# Altium footprint library 5-C-THD.PcbLib: 166 footprints (part 1 of 11)
Each footprint in its own frame and in the unit in brackets; x right, y up, seen from the top. Pads: shape width x height; smd on the part's side, far side on the other; paste and mask are expansions set on the pad; w line width, h text height; cw(c..) or ccw(c..) is an arc to the next point about the centre after c.
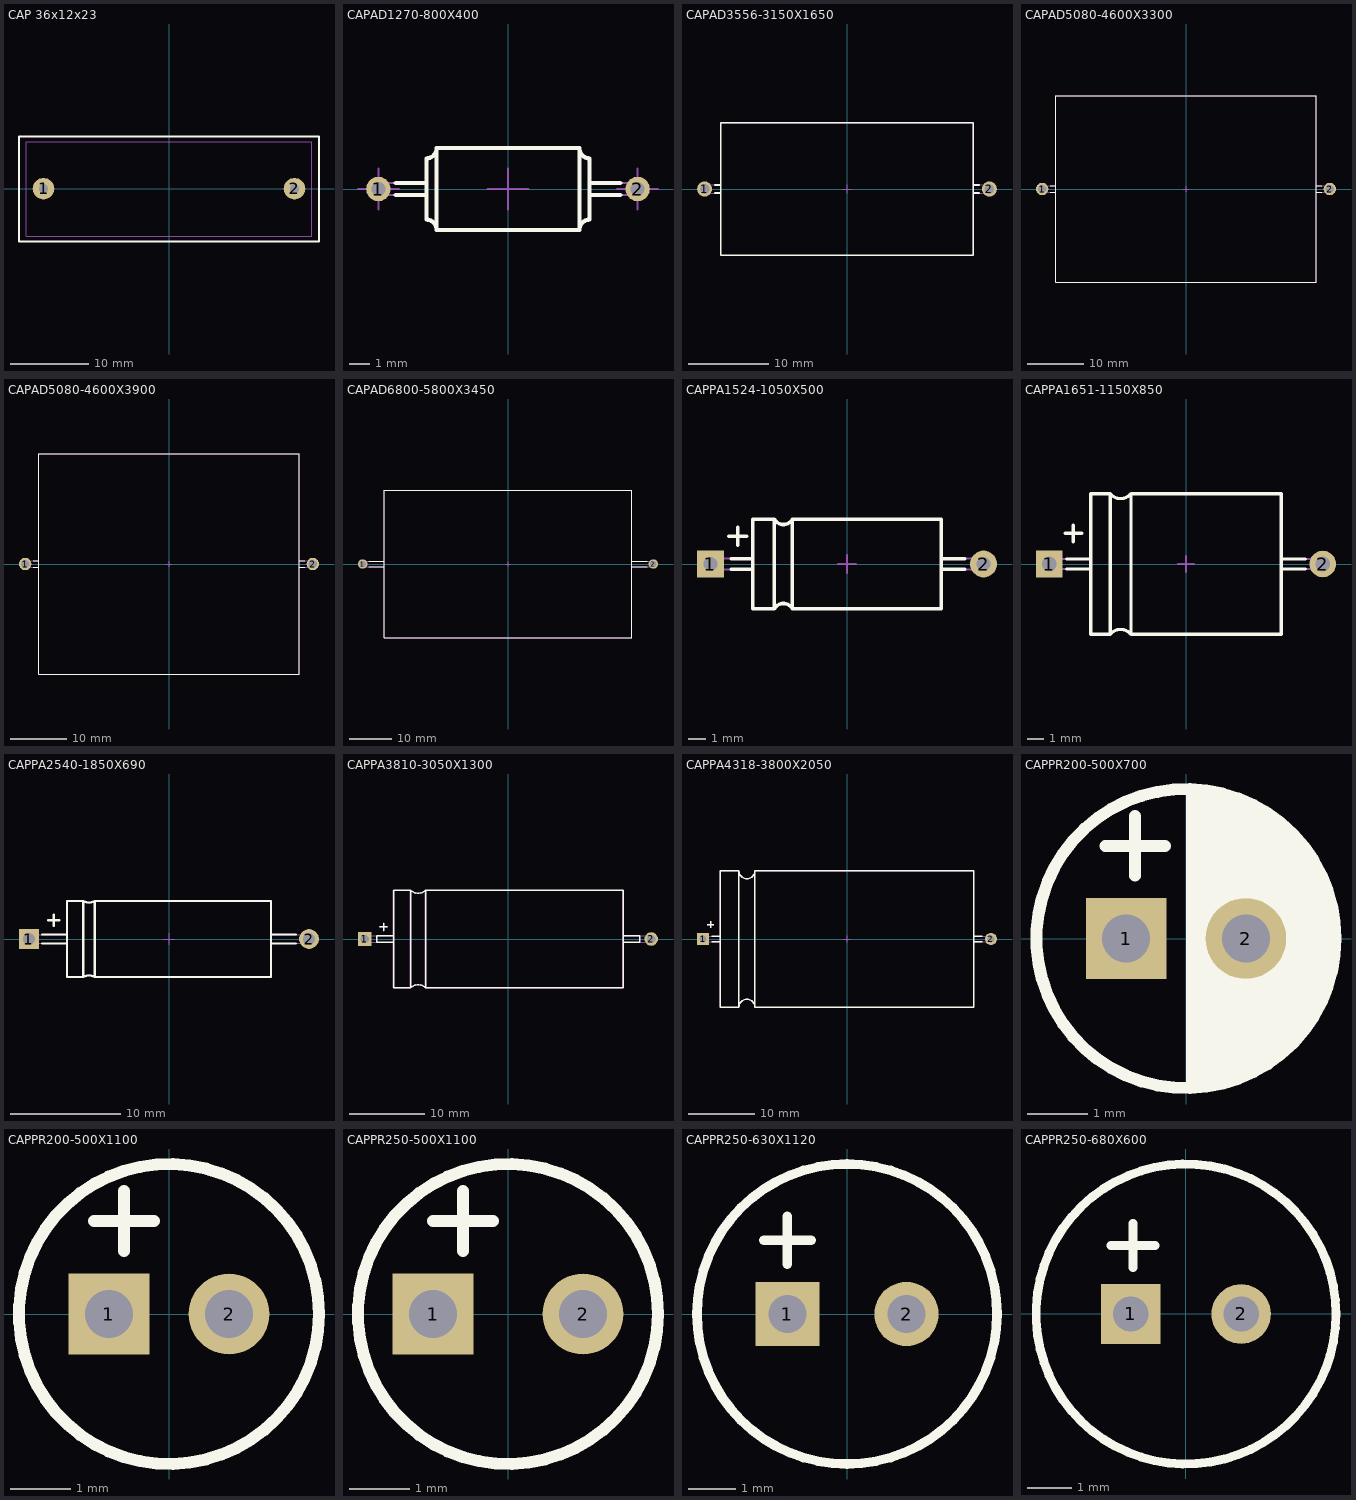
[diagram p0: the footprints below, top view; thin cyan lines are the x and y axes]

## CAP 36x12x23 [mm] "启动电容"
height 3.2
pads (2):
  round 2.75 hole 1.2: 1(-16,0) 2(16,0)
Top Overlay:
  lines w0.254: -19.126,-6.756 19.126,-6.756 19.126,6.68 -19.126,6.68 -19.126,-6.756
Mechanical 15:
  lines w0.127: -18.212,-6.045 18.212,-6.045 18.212,5.994 -18.212,5.994 -18.212,-6.045
3D body "1u-500v.stp": height 23, standoff -3.5, extent -18.5,-6.1 18.5,6

## CAPAD1270-800X400 [mm] "Capacitor Axial, Pin spacing 12.7mm - Body Length 8mm X Body Diameter 4mm"
height 4
pads (2):
  round 1.2 hole 0.7: 1(-6.35,0) 2(6.35,0)
Top Overlay:
  lines w0.2: -5.5,-0.3 -4,-0.3 ; -5.5,0.3 -4,0.3 ; 4,-0.3 5.5,-0.3 ; 4,0.3 5.5,0.3 ; -3.5,-2 ccw(c-4,-2) -4,-1.5 -4,1.5 ccw(c-4,2) -3.5,2 ; -3.5,-2 3.5,-2 ; -3.5,-2 -3.5,2 ; -3.5,2 3.5,2 ; 3.5,-2 cw(c4,-2) 4,-1.5 4,1.5 cw(c4,2) 3.5,2 ; 3.5,-2 3.5,2
Mechanical 8:
  lines w0.1: -7.35,0 -6.35,0 ; -6.35,-1 -6.35,0 ; -6.35,1 -6.35,0 ; -5.35,0 -6.35,0 ; -1,0 0,0 ; 0,-1 0,0 ; 0,1 0,0 ; 1,0 0,0 ; 5.35,0 6.35,0 ; 6.35,-1 6.35,0 ; 6.35,1 6.35,0 ; 7.35,0 6.35,0
Mechanical 14:
  lines w0.1: -4,-0.3 -6.35,-0.3 cw(c-6.35,0) -6.35,0.3 -4,0.3 ; 4,-0.3 6.35,-0.3 ccw(c6.35,0) 6.35,0.3 4,0.3 ; -3.5,-2 ccw(c-4,-2) -4,-1.5 -4,1.5 ccw(c-4,2) -3.5,2 ; -3.5,-2 3.5,-2 ; -3.5,-2 -3.5,2 ; -3.5,2 3.5,2 ; 3.5,-2 cw(c4,-2) 4,-1.5 4,1.5 cw(c4,2) 3.5,2 ; 3.5,-2 3.5,2
3D body "v150-080.stp": height 0.02, standoff -1.65, extent -7.1,-0.75 -5.6,0.75
3D body "v150-080.stp": height 0.02, standoff -1.65, extent 5.6,-0.75 7.1,0.75
3D body "CAPA1270-800X400.stp": height 4, standoff -3.6, extent -6.65,-2 6.65,2

## CAPAD3556-3150X1650 [mm] "Capacitor Axial, Pin spacing 35.56mm - Body Length 31.5mm X Body Diameter 16.5mm"
height 16.5
pads (2):
  round 1.9 hole 1.2: 1(-17.78,0) 2(17.78,0)
Top Overlay:
  lines w0.2: -16.51,-0.5 -15.75,-0.5 ; -16.51,0.5 -15.75,0.5 ; 15.75,-0.5 16.51,-0.5 ; 15.75,0.5 16.51,0.5 ; -15.75,-8.25 -15.75,8.25 15.75,8.25 15.75,-8.25 -15.75,-8.25
Mechanical 8:
  lines w0.1: -18.28,0 -17.78,0 ; -17.78,-0.5 -17.78,0 ; -17.78,0.5 -17.78,0 ; -17.28,0 -17.78,0 ; -0.5,0 0,0 ; 0,-0.5 0,0 ; 0,0.5 0,0 ; 0.5,0 0,0 ; 17.28,0 17.78,0 ; 17.78,-0.5 17.78,0 ; 17.78,0.5 17.78,0 ; 18.28,0 17.78,0
Mechanical 14:
  lines w0.1: -15.75,-0.5 -17.78,-0.5 cw(c-17.78,0) -17.78,0.5 -15.75,0.5 ; 15.75,-0.5 17.78,-0.5 ccw(c17.78,0) 17.78,0.5 15.75,0.5 ; -15.75,-8.25 -15.75,8.25 15.75,8.25 15.75,-8.25 -15.75,-8.25
3D body "CAPAD3556-3150X1650.stp": height 16.5, standoff -3.1, extent -18.28,-8.25 18.28,8.25
3D body "v150-080.stp": height 0.02, standoff -1.65, extent 17.03,-0.75 18.53,0.75
3D body "v150-080.stp": height 0.02, standoff -1.65, extent -18.53,-0.75 -17.03,0.75

## CAPAD5080-4600X3300 [mm] "Capacitor Axial, Pin spacing 50.8mm - Body Length 46mm X Body Diameter 33mm"
height 33
pads (2):
  round 2.2 hole 1.5: 1(-25.4,0) 2(25.4,0)
Top Overlay:
  lines w0.2: -24.025,-0.6 -23,-0.6 ; -24.025,0.6 -23,0.6 ; 23,-0.6 24.025,-0.6 ; 23,0.6 24.025,0.6 ; -23,-16.5 23,-16.5 23,16.5 -23,16.5 -23,-16.5
Mechanical 8:
  lines w0.1: -25.9,0 -25.4,0 ; -25.4,-0.5 -25.4,0 ; -25.4,0.5 -25.4,0 ; -24.9,0 -25.4,0 ; -0.5,0 0,0 ; 0,-0.5 0,0 ; 0,0.5 0,0 ; 0.5,0 0,0 ; 24.9,0 25.4,0 ; 25.4,-0.5 25.4,0 ; 25.4,0.5 25.4,0 ; 25.9,0 25.4,0
Mechanical 14:
  lines w0.1: -23,-0.6 -25.4,-0.6 cw(c-25.4,0) -25.4,0.6 -23,0.6 ; 23,-0.6 25.4,-0.6 ccw(c25.4,0) 25.4,0.6 23,0.6 ; -23,-16.5 23,-16.5 23,16.5 -23,16.5 -23,-16.5
3D body "CAPAD5080-4600X3300.stp": height 33, standoff -3.8, extent -26,-16.5 26,16.5
3D body "v150-080.stp": height 0.02, standoff -1.65, extent 24.65,-0.75 26.15,0.75
3D body "v150-080.stp": height 0.02, standoff -1.65, extent -26.15,-0.75 -24.65,0.75

## CAPAD5080-4600X3900 [mm] "Capacitor Axial, Pin spacing 50.8mm - Body Length 46mm X Body Diameter 39mm"
height 39
pads (2):
  round 2.2 hole 1.5: 1(-25.4,0) 2(25.4,0)
Top Overlay:
  lines w0.2: -24.025,-0.6 -23,-0.6 ; -24.025,0.6 -23,0.6 ; 23,-0.6 24.025,-0.6 ; 23,0.6 24.025,0.6 ; -23,-19.5 23,-19.5 23,19.5 -23,19.5 -23,-19.5
Mechanical 8:
  lines w0.1: -25.9,0 -25.4,0 ; -25.4,-0.5 -25.4,0 ; -25.4,0.5 -25.4,0 ; -24.9,0 -25.4,0 ; -0.5,0 0,0 ; 0,-0.5 0,0 ; 0,0.5 0,0 ; 0.5,0 0,0 ; 24.9,0 25.4,0 ; 25.4,-0.5 25.4,0 ; 25.4,0.5 25.4,0 ; 25.9,0 25.4,0
Mechanical 14:
  lines w0.1: -23,-0.6 -25.4,-0.6 cw(c-25.4,0) -25.4,0.6 -23,0.6 ; 23,-0.6 25.4,-0.6 ccw(c25.4,0) 25.4,0.6 23,0.6 ; -23,-19.5 -23,19.5 23,19.5 23,-19.5 -23,-19.5
3D body "CAPAD5080-4600X3900.stp": height 39, standoff -3.8, extent -26,-19.5 26,19.5
3D body "v150-080.stp": height 0.02, standoff -1.65, extent 24.65,-0.75 26.15,0.75
3D body "v150-080.stp": height 0.02, standoff -1.65, extent -26.15,-0.75 -24.65,0.75

## CAPAD6800-5800X3450 [mm] "Capacitor Axial Diameter, Pin spacing 68mm - Body Length 58mm X Body Diameter 34.5mm"
height 34.5
pads (2):
  round 2.2 hole 1.5: 1(-34,0) 2(34,0)
Top Overlay:
  lines w0.2: -32.625,-0.6 -29,-0.6 ; -32.625,0.6 -29,0.6 ; 29,-0.6 32.625,-0.6 ; 29,0.6 32.625,0.6 ; -29,-17.25 29,-17.25 29,17.25 -29,17.25 -29,-17.25
Mechanical 8:
  lines w0.1: -34.5,0 -34,0 ; -34,-0.5 -34,0 ; -34,0.5 -34,0 ; -33.5,0 -34,0 ; -0.5,0 0,0 ; 0,-0.5 0,0 ; 0,0.5 0,0 ; 0.5,0 0,0 ; 33.5,0 34,0 ; 34,-0.5 34,0 ; 34,0.5 34,0 ; 34.5,0 34,0
Mechanical 14:
  lines w0.1: -29,-0.6 -34,-0.6 cw(c-34,0) -34,0.6 -29,0.6 ; 29,-0.6 34,-0.6 ccw(c34,0) 34,0.6 29,0.6 ; -29,-17.25 29,-17.25 29,17.25 -29,17.25 -29,-17.25
3D body "CAPAD6800-5800X3450.stp": height 34.5, standoff -3.75, extent -34.6,-17.25 34.6,17.25
3D body "v150-080.stp": height 0.02, standoff -1.65, extent 33.25,-0.75 34.75,0.75
3D body "v150-080.stp": height 0.02, standoff -1.65, extent -34.75,-0.75 -33.25,0.75

## CAPPA1524-1050X500 [mm] "Capacitor Axial, Pin spacing 15.24mm - Body Length 10.5mm X Body Diameter 5.0mm"
height 5
pads (2):
  rect 1.5x1.5 hole 0.8: 1(-7.62,0)
  round 1.5 hole 0.8: 2(7.62,0)
Top Overlay:
  lines w0.2: -6.6,1.55 -5.6,1.55 ; -6.47,-0.3 -5.25,-0.3 ; -6.47,0.3 -5.25,0.3 ; -6.1,1.05 -6.1,2.05 ; 5.25,-0.3 6.562,-0.3 ; 5.25,0.3 6.562,0.3 ; -4.05,-2.5 cw(c-3.55,-2.767) -3.05,-2.5 ; -4.05,-2.5 -5.25,-2.5 -5.25,2.5 -4.05,2.5 ; -4.05,-2.5 -4.05,2.5 ; -4.05,2.5 ccw(c-3.55,2.767) -3.05,2.5 ; -3.05,-2.5 5.25,-2.5 5.25,2.5 -3.05,2.5 ; -3.05,-2.5 -3.05,2.5
Mechanical 8:
  lines w0.1: -8.12,0 -7.62,0 ; -7.62,-0.5 -7.62,0 ; -7.62,0.5 -7.62,0 ; -7.12,0 -7.62,0 ; -0.5,0 0,0 ; 0,-0.5 0,0 ; 0,0.5 0,0 ; 0.5,0 0,0 ; 7.12,0 7.62,0 ; 7.62,-0.5 7.62,0 ; 7.62,0.5 7.62,0 ; 8.12,0 7.62,0
Mechanical 14:
  lines w0.1: -6.6,1.55 -5.6,1.55 ; -6.1,1.05 -6.1,2.05 ; -5.25,-0.3 -7.62,-0.3 cw(c-7.62,0) -7.62,0.3 -5.25,0.3 ; 5.25,-0.3 7.62,-0.3 ccw(c7.62,0) 7.62,0.3 5.25,0.3 ; -4.05,-2.5 cw(c-3.55,-2.767) -3.05,-2.5 ; -4.05,-2.5 -5.25,-2.5 -5.25,2.5 -4.05,2.5 ; -4.05,-2.5 -4.05,2.5 ; -4.05,2.5 ccw(c-3.55,2.767) -3.05,2.5 ; -3.05,-2.5 -3.05,2.5 ; -3.05,-2.5 5.25,-2.5 5.25,2.5 -3.05,2.5
3D body "v150-080.stp": height 0.02, standoff -1.65, extent -8.37,-0.75 -6.87,0.75
3D body "v150-080.stp": height 0.02, standoff -1.65, extent 6.87,-0.75 8.37,0.75
3D body "CAPPA1524-1050X500.stp": height 5, standoff -3.1, extent -7.92,-2.5 7.92,2.5

## CAPPA1651-1150X850 [mm] "Capacitor Axial, Pin spacing 16.51mm - Body Length 11.5mm X Body Diameter 8.5mm"
height 8.5
pads (2):
  rect 1.6x1.6 hole 0.9: 1(-8.255,0)
  round 1.6 hole 0.9: 2(8.255,0)
Top Overlay:
  lines w0.2: -7.3,1.85 -6.3,1.85 ; -7.197,-0.3 -5.75,-0.3 ; -7.197,0.3 -5.75,0.3 ; -6.8,1.35 -6.8,2.35 ; 5.75,-0.3 7.197,-0.3 ; 5.75,0.3 7.197,0.3 ; -4.574,-4.25 cw(c-3.948,-4.748) -3.322,-4.25 ; -4.574,-4.25 -5.75,-4.25 -5.75,4.25 -4.574,4.25 ; -4.574,-4.25 -4.574,4.25 ; -4.574,4.25 ccw(c-3.948,4.748) -3.322,4.25 ; -3.322,-4.25 5.75,-4.25 5.75,4.25 -3.322,4.25 ; -3.322,-4.25 -3.322,4.25
Mechanical 8:
  lines w0.1: -8.755,0 -8.255,0 ; -8.255,-0.5 -8.255,0 ; -8.255,0.5 -8.255,0 ; -7.755,0 -8.255,0 ; -0.5,0 0,0 ; 0,-0.5 0,0 ; 0,0.5 0,0 ; 0.5,0 0,0 ; 7.755,0 8.255,0 ; 8.255,-0.5 8.255,0 ; 8.255,0.5 8.255,0 ; 8.755,0 8.255,0
Mechanical 14:
  lines w0.1: -7.3,1.85 -6.3,1.85 ; -6.8,1.35 -6.8,2.35 ; -5.75,-0.3 -8.255,-0.3 cw(c-8.255,0) -8.255,0.3 -5.75,0.3 ; 5.75,-0.3 8.255,-0.3 ccw(c8.255,0) 8.255,0.3 5.75,0.3 ; -4.574,-4.25 cw(c-3.948,-4.748) -3.322,-4.25 ; -4.574,-4.25 -5.75,-4.25 -5.75,4.25 -4.574,4.25 ; -4.574,-4.25 -4.574,4.25 ; -4.574,4.25 ccw(c-3.948,4.748) -3.322,4.25 ; -3.322,-4.25 5.75,-4.25 5.75,4.25 -3.322,4.25 ; -3.322,-4.25 -3.322,4.25
3D body "v150-080.stp": height 0.02, standoff -1.65, extent -9.005,-0.75 -7.505,0.75
3D body "v150-080.stp": height 0.02, standoff -1.65, extent 7.505,-0.75 9.005,0.75
3D body "CAPPA1651-1150X850.stp": height 8.5, standoff -3.8, extent -8.555,-4.25 8.555,4.25

## CAPPA2540-1850X690 [mm] "Capacitor Axial, Pin spacing 25.4mm - Body Length 18.5mm X Body Diameter 6.9mm"
height 6.9
pads (2):
  rect 1.8x1.8 hole 1.1: 1(-12.7,0)
  round 1.8 hole 1.1: 2(12.7,0)
Top Overlay:
  lines w0.2: -11.5,-0.4 -9.25,-0.4 ; -11.5,0.4 -9.25,0.4 ; -10.95,1.7 -9.95,1.7 ; -10.45,1.2 -10.45,2.2 ; 9.25,-0.4 11.5,-0.4 ; 9.25,0.4 11.5,0.4 ; -7.775,-3.45 cw(c-7.25,-4.294) -6.725,-3.45 ; -7.775,-3.45 -7.775,3.45 ; -7.775,-3.45 -9.25,-3.45 -9.25,3.45 -7.775,3.45 ; -7.775,3.45 ccw(c-7.25,4.294) -6.725,3.45 ; -6.725,-3.45 -6.725,3.45 ; -6.725,-3.45 9.25,-3.45 9.25,3.45 -6.725,3.45
Mechanical 8:
  lines w0.1: -13.2,0 -12.7,0 ; -12.7,-0.5 -12.7,0 ; -12.7,0.5 -12.7,0 ; -12.2,0 -12.7,0 ; -0.5,0 0,0 ; 0,-0.5 0,0 ; 0,0.5 0,0 ; 0.5,0 0,0 ; 12.2,0 12.7,0 ; 12.7,-0.5 12.7,0 ; 12.7,0.5 12.7,0 ; 13.2,0 12.7,0
Mechanical 14:
  lines w0.1: -10.95,1.7 -9.95,1.7 ; -10.45,1.2 -10.45,2.2 ; -9.25,-0.4 -12.7,-0.4 cw(c-12.7,0) -12.7,0.4 -9.25,0.4 ; 9.25,-0.4 12.7,-0.4 ccw(c12.7,0) 12.7,0.4 9.25,0.4 ; -7.775,-3.45 cw(c-7.25,-4.294) -6.725,-3.45 ; -7.775,-3.45 -7.775,3.45 ; -7.775,-3.45 -9.25,-3.45 -9.25,3.45 -7.775,3.45 ; -7.775,3.45 ccw(c-7.25,4.294) -6.725,3.45 ; -6.725,-3.45 -6.725,3.45 ; -6.725,-3.45 9.25,-3.45 9.25,3.45 -6.725,3.45
3D body "v150-080.stp": height 0.02, standoff -1.65, extent -13.45,-0.75 -11.95,0.75
3D body "v150-080.stp": height 0.02, standoff -1.65, extent 11.95,-0.75 13.45,0.75
3D body "CAPPA2540-1850X690.stp": height 6.9, standoff -3.6, extent -13.1,-3.45 13.1,3.45

## CAPPA3810-3050X1300 [mm] "Capacitor Axial, Pin spacing 38.1mm - Body Length 30.5mm X Body Diameter 13mm"
height 13
pads (2):
  rect 1.8x1.8 hole 1.1: 1(-19.05,0)
  round 1.8 hole 1.1: 2(19.05,0)
Top Overlay:
  lines w0.2: -17.05,1.6 -16.05,1.6 ; -16.55,1.1 -16.55,2.1 ; -15.2,-0.4 -17.45,-0.4 -17.45,0.4 -15.2,0.4 ; 15.3,-0.4 17.55,-0.4 17.55,0.4 15.3,0.4 ; -12.95,-6.5 cw(c-11.95,-7.5) -10.95,-6.5 ; -12.95,-6.5 -15.2,-6.5 -15.2,6.5 -12.95,6.5 ; -12.95,-6.5 -12.95,6.5 ; -12.95,6.5 ccw(c-11.95,7.5) -10.95,6.5 ; -10.95,-6.5 15.3,-6.5 15.3,6.5 -10.95,6.5 ; -10.95,-6.5 -10.95,6.5
Mechanical 14:
  lines w0.1: -17.05,1.6 -16.05,1.6 ; -16.55,1.1 -16.55,2.1 ; -15.25,-0.4 -19.05,-0.4 cw(c-19,0) -19.05,0.4 -15.25,0.4 ; 15.25,-0.4 19.05,-0.4 ccw(c19,0) 19.05,0.4 15.25,0.4 ; -13,-6.5 cw(c-12,-7.5) -11,-6.5 ; -13,-6.5 -13,6.5 ; -13,-6.5 -15.25,-6.5 -15.25,6.5 -13,6.5 ; -13,6.5 ccw(c-12,7.5) -11,6.5 ; -11,-6.5 -11,6.5 ; -11,-6.5 15.25,-6.5 15.25,6.5 -11,6.5
3D body "v150-080.stp": height 0.02, standoff -1.65, extent -19.8,-0.75 -18.3,0.75
3D body "v150-080.stp": height 0.02, standoff -1.65, extent 18.3,-0.75 19.8,0.75
3D body "CAPPA3810-30500X1300.stp": height 13, standoff -3.8, extent -19.5,-6.5 19.5,6.5

## CAPPA4318-3800X2050 [mm] "Capacitor Axial, Pin spacing 43mm - Body Length 38mm X Body Diameter 20.5mm"
height 20.5
pads (2):
  rect 1.8x1.8 hole 1.1: 1(-21.59,0)
  round 1.8 hole 1.1: 2(21.59,0)
Top Overlay:
  lines w0.2: -20.95,2.15 -19.95,2.15 ; -20.45,1.65 -20.45,2.65 ; -20.248,-0.4 -19,-0.4 ; -20.248,0.4 -19,0.4 ; 19,-0.4 20.248,-0.4 ; 19,0.4 20.248,0.4 ; -16.2,-10.25 cw(c-15,-10.25) -13.8,-10.25 ; -16.2,-10.25 -16.2,10.25 ; -16.2,-10.25 -19,-10.25 -19,10.25 -16.2,10.25 ; -16.2,10.25 ccw(c-15,10.25) -13.8,10.25 ; -13.8,-10.25 -13.8,10.25 ; -13.8,-10.25 19,-10.25 19,10.25 -13.8,10.25
Mechanical 8:
  lines w0.1: -22.09,0 -21.59,0 ; -21.59,-0.5 -21.59,0 ; -21.59,0.5 -21.59,0 ; -21.09,0 -21.59,0 ; -0.5,0 0,0 ; 0,-0.5 0,0 ; 0,0.5 0,0 ; 0.5,0 0,0 ; 21.09,0 21.59,0 ; 21.59,-0.5 21.59,0 ; 21.59,0.5 21.59,0 ; 22.09,0 21.59,0
Mechanical 14:
  lines w0.1: -20.95,2.15 -19.95,2.15 ; -20.45,1.65 -20.45,2.65 ; -19,-0.4 -21.59,-0.4 cw(c-21.59,0) -21.59,0.4 -19,0.4 ; 19,-0.4 21.59,-0.4 ccw(c21.59,0) 21.59,0.4 19,0.4 ; -16.2,-10.25 cw(c-15,-10.25) -13.8,-10.25 ; -16.2,-10.25 -16.2,10.25 ; -16.2,-10.25 -19,-10.25 -19,10.25 -16.2,10.25 ; -16.2,10.25 ccw(c-15,10.25) -13.8,10.25 ; -13.8,-10.25 19,-10.25 19,10.25 -13.8,10.25 ; -13.8,-10.25 -13.8,10.25
3D body "v150-080.stp": height 0.02, standoff -1.65, extent -22.34,-0.75 -20.84,0.75
3D body "v150-080.stp": height 0.02, standoff -1.65, extent 20.84,-0.75 22.34,0.75
3D body "CAPPA4318-3800X2050.stp": height 20.5, standoff -3.8, extent -21.99,-10.25 21.99,10.25

## CAPPR200-500X700 [mm] "Capacitor, Radial, Pin spacing 2.0mm - Body Diameter 5.0mm X Body Height 7mm"
height 7
pads (2):
  rect 1.35x1.35 hole 0.8: 1(-1,0)
  round 1.35 hole 0.8: 2(1,0)
Top Overlay:
  circle w0.2: c0,0 r2.5
  region: 0,-2.515 0,2.489 0.635,2.388 1.295,2.108 1.981,1.6 2.311,0.965 2.489,0.279 2.489,-0.305 2.261,-1.118 1.803,-1.778 1.295,-2.159 0.686,-2.438
  lines w0.2: -1.35,1.55 -0.35,1.55 ; -0.85,1.05 -0.85,2.05
Mechanical 13:
  circle w0.1: c0,0 r2.5
Mechanical 14:
  circle w0.1: c0,0 r2.5
  lines w0.1: -1.35,1.55 -0.35,1.55 ; -0.85,1.05 -0.85,2.05
3D body "CAPPR200-500X700.stp": height 7, standoff -3.6, extent -2.512,-2.512 2.488,2.488

## CAPPR200-500X1100 [mm] "Capacitor, Radial, Pin spacing 2.0mm - Body Diameter 5.0mm X Body Height 11mm"
height 11
pads (2):
  rect 1.35x1.35 hole 0.8: 1(-1,0)
  round 1.35 hole 0.8: 2(1,0)
Top Overlay:
  circle w0.2: c0,0 r2.5
  lines w0.2: -1.25,1.55 -0.25,1.55 ; -0.75,1.05 -0.75,2.05
Mechanical 13:
  circle w0.1: c0,0 r2.5
Mechanical 14:
  circle w0.1: c0,0 r2.5
  lines w0.1: -1.25,1.55 -0.25,1.55 ; -0.75,1.05 -0.75,2.05
3D body "CAPPR200-500X1100.stp": height 10.9, standoff -3.6, extent -2.512,-2.512 2.488,2.488

## CAPPR250-500X1100 [mm] "Capacitor, Radial, Pin spacing 2.5mm - Body Diameter 5.0mm X Body Height 11mm"
height 11
pads (2):
  rect 1.35x1.35 hole 0.8: 1(-1.25,0)
  round 1.35 hole 0.8: 2(1.25,0)
Top Overlay:
  circle w0.2: c0,0 r2.5
  lines w0.2: -1.25,1.55 -0.25,1.55 ; -0.75,1.05 -0.75,2.05
Mechanical 13:
  circle w0.1: c0,0 r2.5
Mechanical 14:
  circle w0.1: c0,0 r2.5
  lines w0.1: -1.25,1.55 -0.25,1.55 ; -0.75,1.05 -0.75,2.05
3D body "CAPPR250-500X1100.stp": height 10.9, standoff -3.6, extent -2.512,-2.512 2.488,2.488

## CAPPR250-630X1120 [mm] "Capacitor, Radial, Pin spacing 2.5mm - Body Diameter 6.3mm X Body Height 11.2mm"
height 11.2
pads (2):
  rect 1.35x1.35 hole 0.8: 1(-1.25,0)
  round 1.35 hole 0.8: 2(1.25,0)
Top Overlay:
  circle w0.2: c0,0 r3.15
  lines w0.2: -1.75,1.55 -0.75,1.55 ; -1.25,1.05 -1.25,2.05
Mechanical 13:
  circle w0.1: c0,0 r3.15
Mechanical 14:
  circle w0.1: c0,0 r3.15
  lines w0.1: -1.75,1.55 -0.75,1.55 ; -1.25,1.05 -1.25,2.05
3D body "CAPPR250-630X1120.stp": height 11.2, standoff -3.6, extent -3.159,-3.176 3.141,3.124

## CAPPR250-680X600 [mm] "Capacitor, Radial, Pin spacing 2.5mm - Body Diameter 6.8mm X Body Height 6.0mm"
height 6
pads (2):
  rect 1.35x1.35 hole 0.8: 1(-1.25,0)
  round 1.35 hole 0.8: 2(1.25,0)
Top Overlay:
  circle w0.2: c0,0 r3.4
  lines w0.2: -1.7,1.55 -0.7,1.55 ; -1.2,1.05 -1.2,2.05
Mechanical 13:
  circle w0.1: c0,0 r3.4
Mechanical 14:
  circle w0.1: c0,0 r3.4
  lines w0.1: -1.7,1.55 -0.7,1.55 ; -1.2,1.05 -1.2,2.05
3D body "CAPPR250-680X600.stp": height 6, standoff -3.6, extent -3.41,-3.41 3.39,3.39